# Altium footprint library PcbLib.PcbLib: 87 footprints (part 2 of 6)
Each footprint in its own frame and in the unit in brackets; x right, y up, seen from the top. Pads: shape width x height; smd on the part's side, far side on the other; paste and mask are expansions set on the pad; w line width, h text height; cw(c..) or ccw(c..) is an arc to the next point about the centre after c.
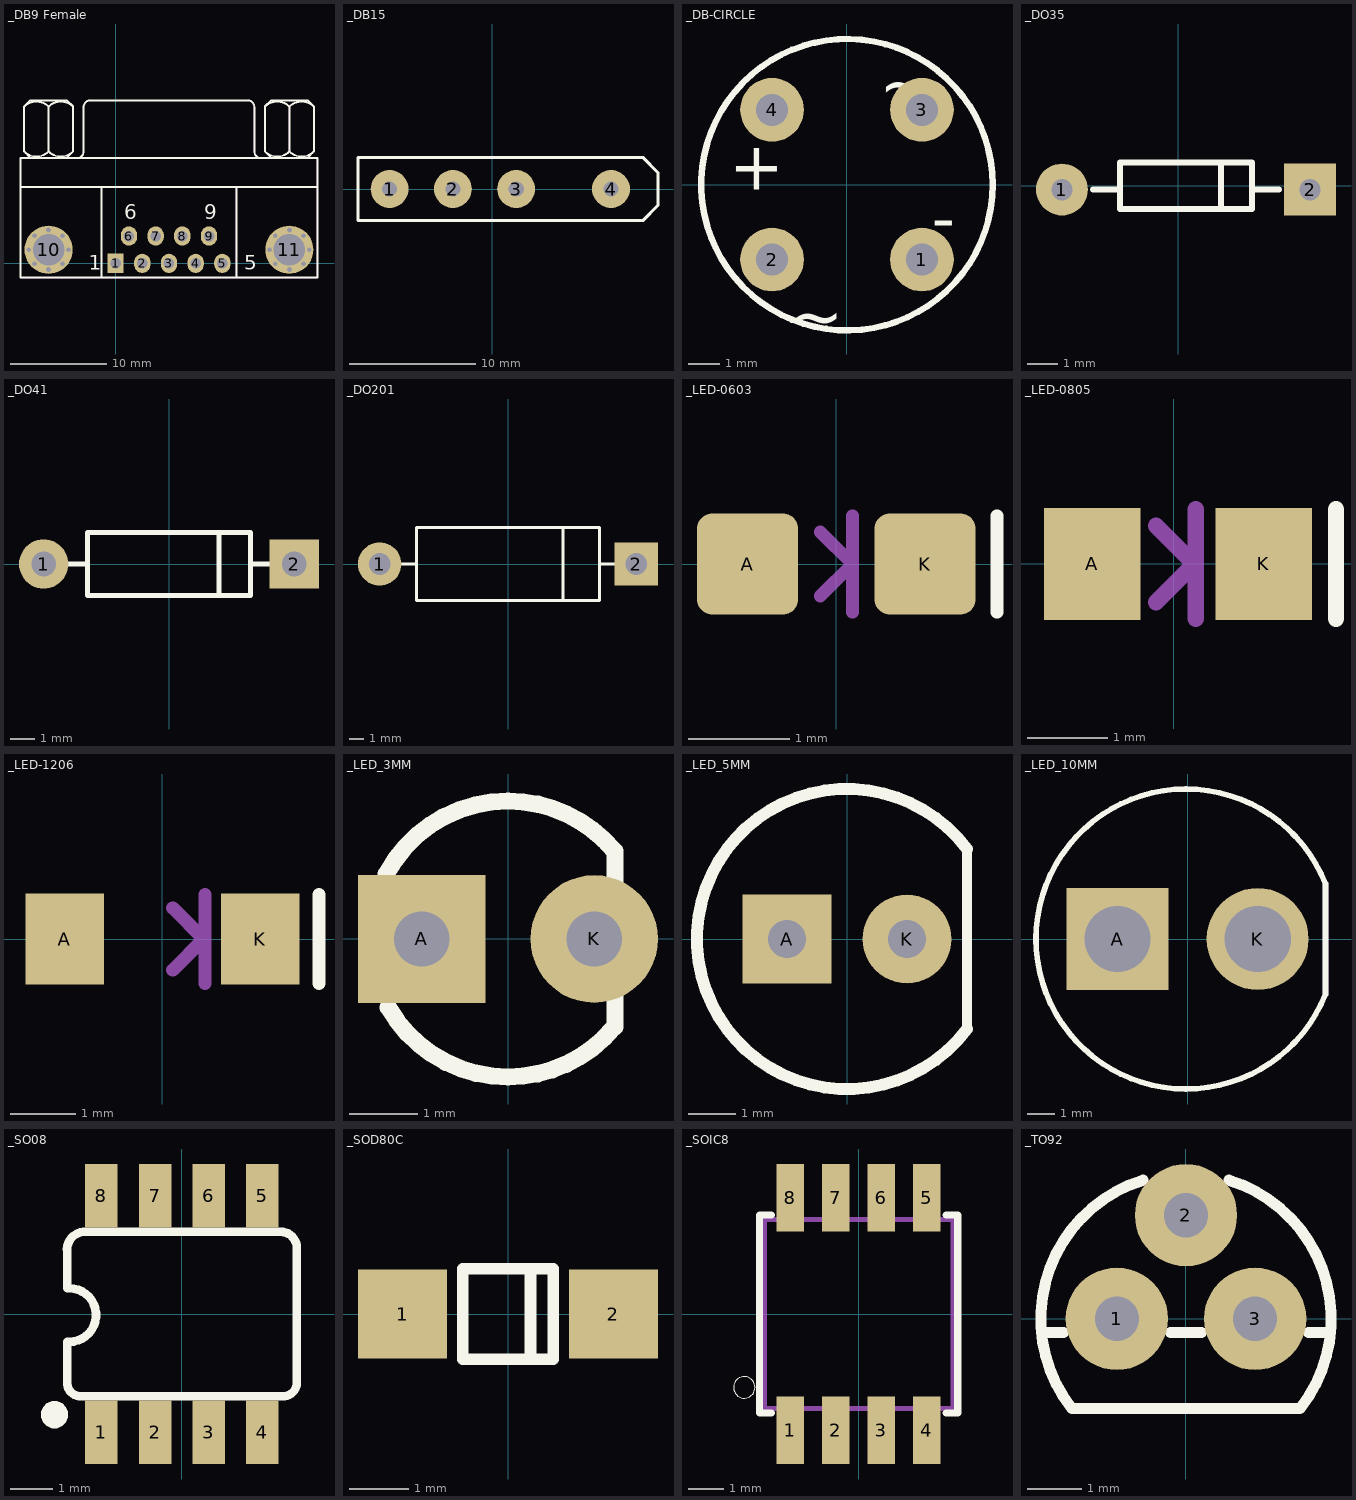
[diagram p1: the footprints below, top view; thin cyan lines are the x and y axes]

## _DB9 Female [mm] "Connector; D Subminiature AMPLIMITE 2000; 9 Position; Right Angle"
height 12.75
pads (27):
  rect 1.69x2 hole 1.09: 1(0,0)
  oval 1.69x2 hole 1.09: 2(2.77,0) 3(5.54,0) 4(8.31,0) 5(11.08,0) 6(1.385,2.84) 7(4.155,2.84) 8(6.925,2.84) 9(9.695,2.84)
  round 0.8 hole 0.5: 10(-9.015,1.42) 10(-8.412,-0.037) 10(-8.412,2.877) 10(-6.955,-0.64) 10(-6.955,3.48) 10(-5.498,-0.037) 10(-5.498,2.877) 10(-4.895,1.42) 11(15.975,1.42) 11(16.578,-0.037) 11(16.578,2.877) 11(18.035,-0.64) 11(18.035,3.48) 11(19.492,-0.037) 11(19.492,2.877) 11(20.095,1.42)
  round 5 hole 3.26: 10(-6.955,1.42) 11(18.035,1.42)
Top Overlay:
  lines w0.2: -9.86,7.92 20.94,7.92 ; -9.498,16.27 -9.498,11.619 -8.863,10.984 ; -9.498,16.285 -8.863,16.92 -5.053,16.92 -4.418,16.285 ; -6.958,11.619 -6.958,16.27 ; -5.053,10.984 -4.418,11.619 -4.418,16.27 ; -4.418,15.006 -4.418,15.218 ; -4.02,10.925 ccw(c-4.02,11.62) -3.325,11.62 -3.325,16.22 ; -3.32,16.225 cw(c-2.625,16.225) -2.625,16.92 13.705,16.92 cw(c13.705,16.225) 14.4,16.225 ; -1.46,-1.48 -1.46,7.92 ; 12.54,-1.48 12.54,7.92 ; 14.405,16.22 14.405,11.62 ccw(c15.1,11.62) 15.1,10.925 ; 15.502,16.27 15.502,11.619 16.137,10.984 ; 15.502,16.285 16.137,16.92 19.947,16.92 20.582,16.285 ; 18.042,11.619 18.042,16.27 ; 19.947,10.984 20.582,11.619 20.582,16.27 ; 20.582,15.006 20.582,15.218 ; -9.86,-1.48 20.94,-1.48 20.94,10.92 -9.86,10.92 -9.86,-1.48
  lines w0.203: -9.5,11.617 ccw(c-8.228,12.889) -6.956,11.617 ; -9.498,16.27 cw(c-8.226,14.998) -6.953,16.27 ; -6.962,16.27 cw(c-5.69,14.998) -4.418,16.27 ; -6.96,11.617 ccw(c-5.688,12.889) -4.416,11.617 ; 15.5,11.617 ccw(c16.772,12.889) 18.044,11.617 ; 15.502,16.27 cw(c16.774,14.998) 18.047,16.27 ; 18.038,16.27 cw(c19.31,14.998) 20.582,16.27 ; 18.04,11.617 ccw(c19.312,12.889) 20.584,11.617
  text "6" at 0.9,4.6 h1.5
  text "9" at 9.2,4.6 h1.5
  text "5" at 13.335,-0.64 h1.5
  text "1" at -2.794,-0.64 h1.5
Mechanical 1:
  lines w0.1: -4.02,10.925 ccw(c-4.02,11.62) -3.325,11.62 ; -3.32,16.225 cw(c-2.625,16.225) -2.625,16.92 ; 13.705,16.92 cw(c13.705,16.225) 14.4,16.225 ; 14.405,11.62 ccw(c15.1,11.62) 15.1,10.925
Mechanical 13:
  lines w0.1: -9.86,7.92 20.94,7.92 ; -9.5,11.617 ccw(c-8.228,12.889) -6.956,11.617 ; -9.498,16.285 -8.863,16.92 -5.053,16.92 -4.418,16.285 ; -8.863,10.984 -9.498,11.619 -9.498,16.27 cw(c-8.226,14.998) -6.953,16.27 ; -6.962,16.27 cw(c-5.69,14.998) -4.418,16.27 -4.418,11.619 -5.053,10.984 ; -6.96,11.617 ccw(c-5.688,12.889) -4.416,11.617 ; -6.958,11.619 -6.958,16.27 ; -4.418,15.006 -4.418,15.218 ; -3.325,11.62 -3.325,16.22 ; -2.625,16.92 13.705,16.92 ; -1.46,-1.48 -1.46,7.92 ; 12.54,-1.48 12.54,7.92 ; 14.405,11.62 14.405,16.22 ; 15.5,11.617 ccw(c16.772,12.889) 18.044,11.617 ; 15.502,16.285 16.137,16.92 19.947,16.92 20.582,16.285 ; 16.137,10.984 15.502,11.619 15.502,16.27 cw(c16.774,14.998) 18.047,16.27 ; 18.038,16.27 cw(c19.31,14.998) 20.582,16.27 20.582,11.619 19.947,10.984 ; 18.04,11.617 ccw(c19.312,12.889) 20.584,11.617 ; 18.042,11.619 18.042,16.27 ; 20.582,15.006 20.582,15.218 ; -9.86,-1.48 20.94,-1.48 20.94,10.92 -9.86,10.92 -9.86,-1.48
3D body "9-PIN_DSUB-1.STEP": height 12.71, standoff -3.01, extent -9.865,-2.034 20.945,17.041

## _DB15 [mm]
pads (4):
  round 3 hole 1.2: 1(-8.128,0) 2(-3.128,0) 3(1.872,0) 4(9.372,0)
Top Overlay:
  lines w0.25: -10.628,-2.5 -10.628,2.5 11.872,2.5 13.081,1.291 13.081,-1.291 11.872,-2.5 -10.628,-2.5

## _DB-CIRCLE [mm]
pads (4):
  round 2 hole 1: 1(2.35,-2.35) 2(-2.35,-2.35) 3(2.35,2.35) 4(-2.35,2.35)
Top Overlay:
  circle w0.2: c0,0 r4.572
  text "~" at 1.016,2.413 h1.5
  text "~" at -1.831,-4.841 h1.5
  text "+" at -3.698,-0.152 h1.5
  text "-" at 2.667,-1.778 h1.5

## _DO35 [mm]
pads (2):
  round 1.7 hole 0.7: 1(-3.81,-0.127)
  rect 1.7x1.7 hole 0.7: 2(4.318,-0.127)
Top Overlay:
  lines w0.2: -2.794,-0.127 -2.032,-0.127 ; 1.397,-0.762 1.397,0.762 ; 2.54,-0.127 3.302,-0.127 ; -1.905,-0.762 -1.905,0.762 2.413,0.762 2.413,-0.762 -1.905,-0.762

## _DO41 [mm]
height 2.54
pads (2):
  round 2 hole 1: 1(-5.08,0)
  rect 2x2 hole 1: 2(5.08,0)
Top Overlay:
  lines w0.2: -4.064,0 -3.302,0 ; 2.032,-1.27 2.032,1.27 ; 3.302,0 4.064,0 ; -3.302,-1.27 -3.302,1.27 3.302,1.27 3.302,-1.27 -3.302,-1.27

## _DO201 [mm]
height 5.08
pads (2):
  round 3 hole 1.5: 1(-8.89,0)
  rect 3x3 hole 1.5: 2(8.89,0)
Top Overlay:
  lines w0.2: -7.366,0 -6.35,0 ; 3.81,-2.54 3.81,2.54 ; 6.35,0 7.366,0 ; -6.35,-2.54 -6.35,2.54 6.35,2.54 6.35,-2.54 -6.35,-2.54

## _LED-0603 [mm]
pads (2):
  rrect30% 1x1 smd: A(-0.877,0) K(0.877,0)
Top Overlay:
  lines w0.127: 1.587,-0.476 1.587,0.476
Mechanical 16:
  lines w0.127: -0.159,-0.318 0.159,0 ; -0.159,0.318 0.159,0 ; 0.159,-0.476 0.159,0 ; 0.159,0.476 0.159,0

## _LED-0805 [mil]
pads (2):
  rect 47.24x55.12 smd: A(-40,0) K(44.06,0)
Top Overlay:
  lines w8: 79.49,-26.87 79.49,26.87
Mechanical 16:
  lines w8: -8.75,-18.75 10,0 -8.75,18.75 ; 10.74,-26.87 10.74,26.87

## _LED-1206 [mm]
pads (2):
  rect 1.2x1.4 smd: A(-1.5,0) K(1.5,0)
Top Overlay:
  lines w0.203: 2.4,-0.682 2.4,0.682
Mechanical 16:
  lines w0.203: 0.159,-0.476 0.635,0 0.159,0.476 ; 0.654,-0.682 0.654,0.682

## _LED_3MM [mil]
pads (2):
  rect 74x74 hole 32: A(-50,0)
  round 74 hole 32: K(50,0)
Top Overlay:
  lines w10: -70.59,37.65 cw(c0,0) 0,80 cw(c0.01,0) 61.46,51.22 ; -69.46,-39.69 ccw(c0,0) 0,-80 ccw(c0,0) 61.07,-51.68 ; 62,-51 62,-33 ; 62,31 62,51
Bottom Overlay:
  lines w10: -70.59,37.65 cw(c0,0) 0,80 cw(c0.01,0) 61.46,51.22 ; -69.46,-39.69 ccw(c0,0) 0,-80 ccw(c0,0) 61.07,-51.68 ; 62,-51 62,-33 ; 62,31 62,51

## _LED_5MM [mil]
pads (2):
  rect 74x74 hole 32: A(-50,0)
  round 74 hole 32: K(50,0)
Top Overlay:
  lines w8: 100,-75 100,75
  lines w10: 100,-75 cw(c0,0) 100,75
Mechanical 16:
  lines w8: 100,-75 100,75

## _LED_10MM [mm]
pads (2):
  rect 3.7x3.7 hole 2.4: A(-2.54,0)
  round 3.7 hole 2.4: K(2.54,0)
Top Overlay:
  lines w0.203: 5,-2 cw(c-0.059,0) 5,2 5,-2
Bottom Overlay:
  lines w0.203: 5,-2 5,2
Mechanical 16:
  lines w0.203: 5,-2 5,2

## _SO08 [mm]
pads (8):
  rect 0.77x1.5 smd: 1(-1.905,-2.8) 2(-0.635,-2.8) 3(0.635,-2.8) 4(1.905,-2.8) 5(1.905,2.8) 6(0.635,2.8) 7(-0.635,2.8) 8(-1.905,2.8)
Top Overlay:
  region: -2.699,-2.381 -2.699,-2.318 -2.747,-2.201 -2.836,-2.112 -2.953,-2.064 -3.016,-2.064 -3.079,-2.064 -3.196,-2.112 -3.285,-2.201 -3.334,-2.318 -3.334,-2.381 -3.334,-2.444 -3.285,-2.561 -3.196,-2.65 -3.079,-2.699 -3.016,-2.699 -2.953,-2.699 -2.836,-2.65 -2.747,-2.561 -2.699,-2.444
  lines w0.203: -2.718,-0.66 -2.718,-1.665 ccw(c-2.387,-1.616) -2.337,-1.946 2.437,-1.946 ccw(c2.387,-1.615) 2.718,-1.565 2.718,1.565 ccw(c2.337,1.566) 2.337,1.946 -2.337,1.946 ccw(c-2.287,1.515) -2.718,1.465 ; -2.718,0.61 -2.718,1.453 ; -2.667,-0.66 ccw(c-2.667,-0.025) -2.667,0.61
Mechanical 16:
  rectangle: -2.159,2.286 -1.651,3.302
  rectangle: 1.651,2.286 2.159,3.302
  rectangle: 0.381,2.286 0.889,3.302
  rectangle: -0.889,2.286 -0.381,3.302
  rectangle: 1.651,-3.302 2.159,-2.273
  rectangle: 0.381,-3.302 0.889,-2.273
  rectangle: -0.889,-3.302 -0.381,-2.273
  rectangle: -2.159,-3.302 -1.651,-2.273

## _SOD80C [mm]
pads (2):
  rect 1.5x1.5 smd: 1(-1.778,0) 2(1.778,0)
Top Overlay:
  lines w0.2: 0.381,-0.762 0.381,0.762 ; -0.762,-0.762 -0.762,0.762 0.762,0.762 0.762,-0.762 -0.762,-0.762

## _SOIC8 [mm]
pads (8):
  rect 0.77x1.88 smd: 1(-1.905,-3.251) 2(-0.635,-3.251) 3(0.635,-3.251) 4(1.905,-3.251) 5(1.905,3.251) 6(0.635,3.251) 7(-0.635,3.251) 8(-1.905,3.251)
Top Overlay:
  circle w0: c-3.194,-2.051 r0.3
  lines w0.203: -2.44,-2.767 -2.767,-2.767 -2.767,2.767 -2.44,2.767 ; 2.44,-2.767 2.767,-2.767 2.767,2.767 2.44,2.767
Mechanical 16:
  rectangle: -2.083,-3.95 -1.727,-2.64
  rectangle: -0.813,-3.95 -0.457,-2.64
  rectangle: 0.457,-3.95 0.813,-2.64
  rectangle: 1.727,-3.95 2.083,-2.64
  region: 2.083,3.95 1.727,3.95 1.727,2.64 2.083,2.64
  region: 0.813,3.95 0.457,3.95 0.457,2.64 0.813,2.64
  region: -0.457,3.95 -0.813,3.95 -0.813,2.64 -0.457,2.64
  region: -1.727,3.95 -2.083,3.95 -2.083,2.64 -1.727,2.64
  lines w0.152: -2.64,-2.64 2.64,-2.64 2.64,2.64 -2.64,2.64 -2.64,-2.64

## _TO92 [mil]
pads (3):
  round 74 hole 32: 1(-50,0) 2(0,75) 3(50,0)
Top Overlay:
  lines w8: -104.52,-10 -88.73,-10 ; -30.96,100.33 ccw(c0,0) -82.46,-65 82.46,-65 ccw(c0,0) 30.96,100.33 ; -11.27,-10 11.27,-10 ; 88.73,-10 104.52,-10